# Altium schematic symbol library AD_Lib.SchLib: 1239 symbols (part 5 of 9)
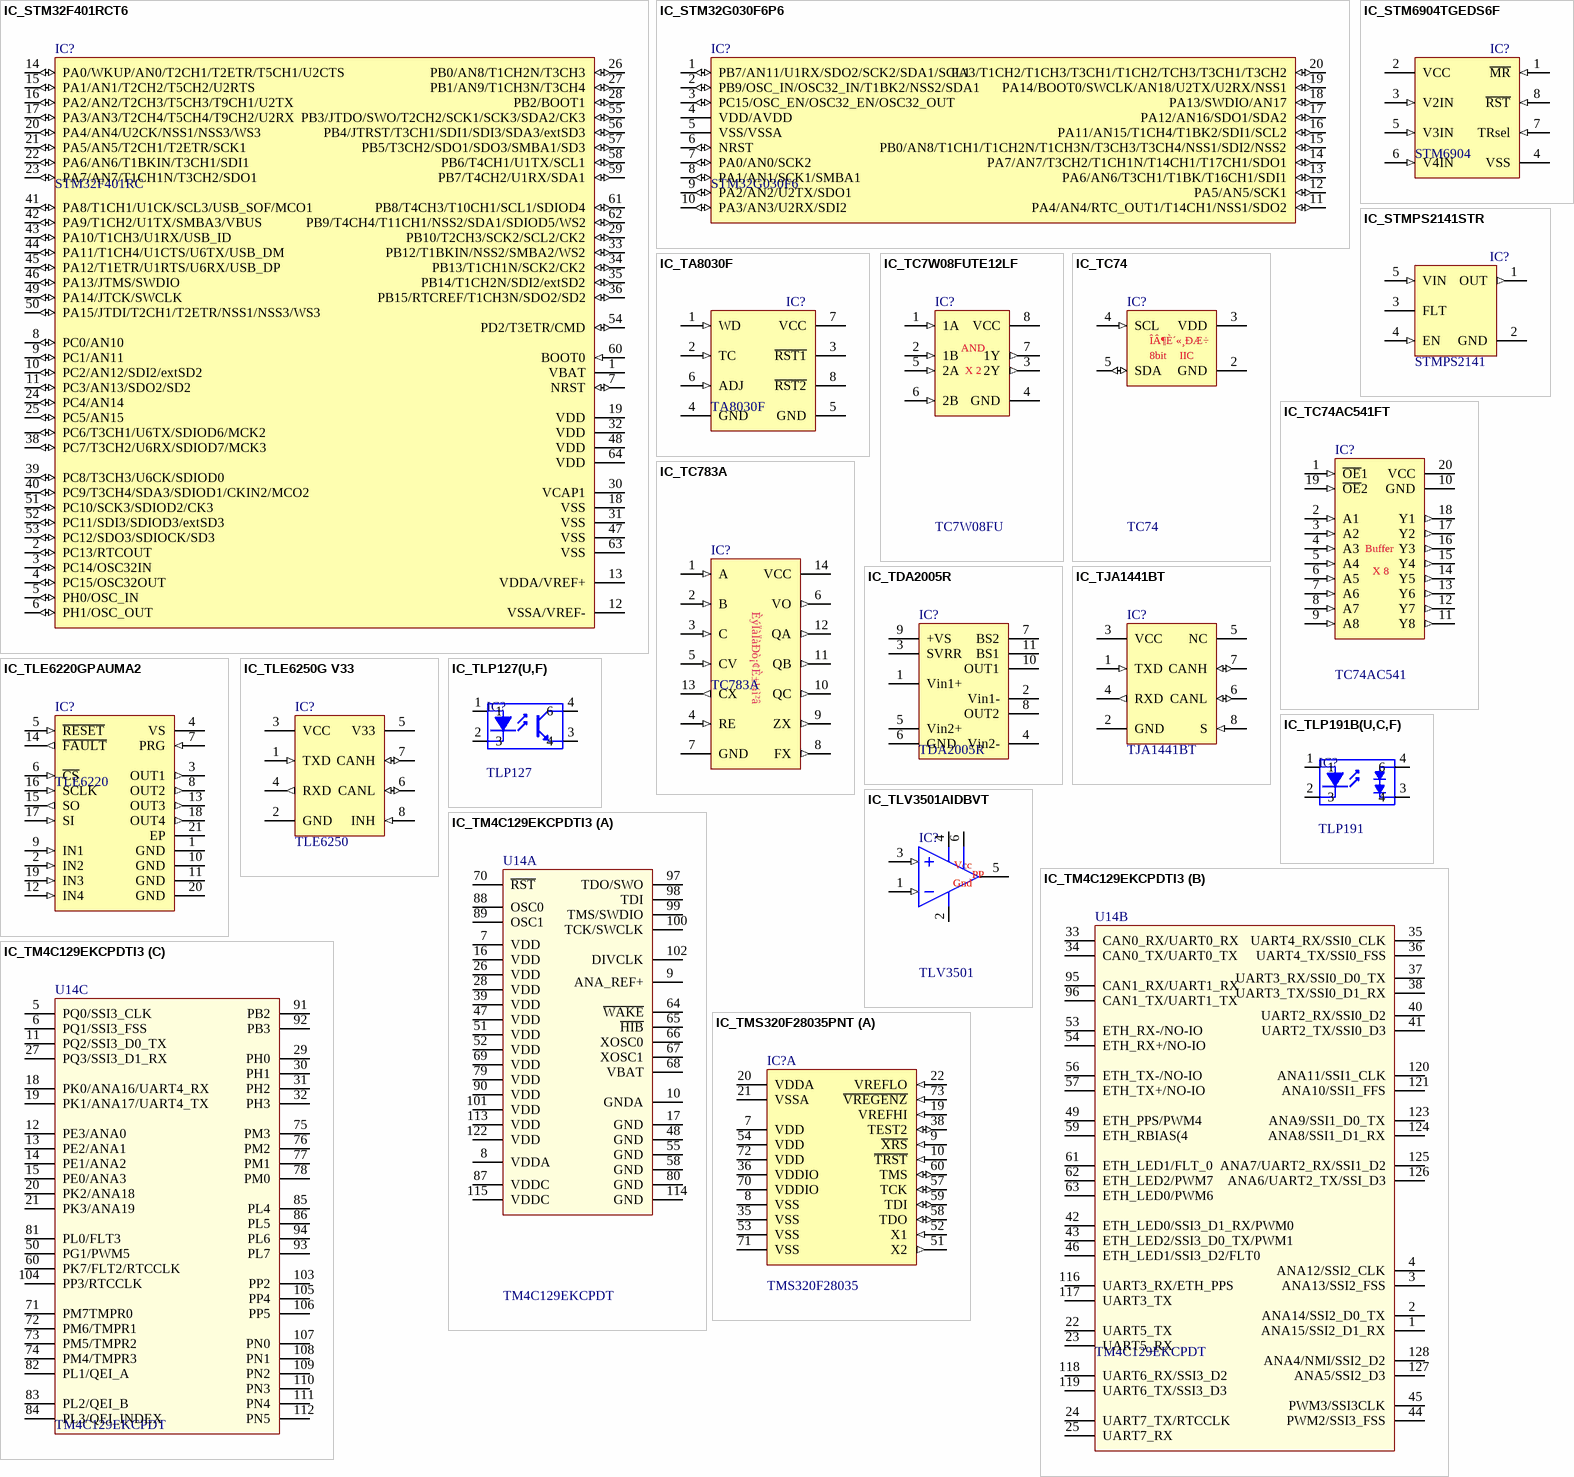
[diagram p46: symbols IC_STM32F401RCT6 to IC_TMS320F28035PNT]

## IC_TC74
designator IC?, comment TC74
ÎÂ¶È´«¸ÐÆ÷; 8bit; 2.7~5.5V; I2C;; Manufacturer: Microchip; pro-environment: RoHS; Quality: -40~85¡æ; Value: 8bit,2.7~5.5V,IIC; OPN: TC74A5-3.3VCTTR; PadsNum: 0; SN: SN; Category: ¼¯³ÉÐ¾Æ¬; Part: TC74; QTY: 3000; other: ÎÂ¶È´«¸ÐÆ÷; 8bit; 2.7~5.5V; I2C;; Price: 5.5107; OPN_JLC: OPN_JLC; SN_JLC: SN_JLC; Price_JLC: 0
footprint SOT23-5 (SOT23, 5-Leads, Body 2.9x1.6mm, Pitch 0.95mm, Lead Span 2.7mm, IPC Low Density)
pins: 2 GND (power), 3 VDD (power), 4 SCL (in), 5 SDA (io)
text: ÎÂ¶È´«¸ÐÆ÷; 8bit; IIC

## IC_TC74AC541FT
designator IC?, comment TC74AC541
»º³åÆ÷;8bit; Manufacturer: Toshiba; pro-environment: RoHS; Quality: -65~125¡æ; Value: Buffer; other: Vcc=2~5.5V; OPN: TC74AC541FT; PadsNum: 0; SN: SN; Category: ¼¯³ÉÐ¾Æ¬; Part: TC74AC541; Price: ?; OPN_JLC: OPN_JLC; SN_JLC: SN_JLC; Price_JLC: 0
footprint TSSOP-20 (Shrink Small Outline; 20 Leads; Body Width 4.4 mm; Pitch 0.65 mm)
pins: 1 ~{OE}1 (in), 2 A1 (in), 3 A2 (in), 4 A3 (in), 5 A4 (in), 6 A5 (in), 7 A6 (in), 8 A7 (in), 9 A8 (in), 10 GND (power), 11 Y8 (out), 12 Y7 (out), 13 Y6 (out), 14 Y5 (out), 15 Y4 (out), 16 Y3 (out), 17 Y2 (out), 18 Y1 (out), 19 ~{OE}2 (in), 20 VCC (power)
text: X 8

## IC_TC783A
designator IC?, comment TC783A
3ÏàÏàÐò¼ì²â;È±Ïà¼ì²â; Manufacturer: Î÷°²¹ã½ÇµçÁ¦µç×Ó¿ª·¢²¿; Quality: -40~125¡æ; Value: ÏàÐò,È±Ïà¼ì²â; pro-environment: RoHS; PadsNum: 0; SN: SN; other: 3ÏàÏàÐò¼ì²â;È±Ïà¼ì²â; Category: ¼¯³ÉÐ¾Æ¬; OPN: TC783A; Part: TC783A; QTY: 40; Price: 52; OPN_JLC: OPN_JLC; SN_JLC: SN_JLC; Price_JLC: 0
footprint DIP-14 (Footprint not found)
pins: 1 A (in), 2 B (in), 3 C (in), 4 RE (in), 5 CV (in), 6 VO (out), 7 GND (power), 8 FX (out), 9 ZX (out), 10 QC (out), 11 QB (out), 12 QA (out), 13 CX (out), 14 VCC (power)
text: ÈýÏàÏàÐò¡¢È±¼ì²â

## IC_TDA2005R
designator IC?, comment TDA2005R
¹¦ÂÊÔË·Å; Io=4.5A; 8~18V; Manufacturer: TI; Quality: -40~150¡æ; pro-environment: RoHS; other: Io=4.5A;22W;Ro=4¦¸; PadsNum: 0; Value: 8~18V; SN: SN; Category: ¼¯³ÉÐ¾Æ¬; OPN: TDA2005R; Part: TDA2005R; QTY: 500; Price: 14.2389; OPN_JLC: OPN_JLC; SN_JLC: SN_JLC; Price_JLC: 0
footprint TO220-11B_HT (TO, Thru-Hole, Vertical, Heatsink Mounted; 11 Bent Staggered Leads; Pitch 1.7 mm)
pins: 1 Vin1+, 2 Vin1-, 3 SVRR, 4 Vin2-, 5 Vin2+, 6 GND, 7 BS2, 8 OUT2, 9 +VS, 10 OUT1, 11 BS1

## IC_TJA1441BT
designator IC?, comment TJA1441BT
CAN Tranceiver supports CAN & CAN FD upto 5Mbd; Manufacturer: NXP; Quality: -40~150°C; Value: CAN,5MBd; pro-environment: RoHS; other: 4.5~5.5V; PadsNum: 0; Category: CAN Interface IC; OPN: TJA1441BT; Part: TJA1441BT; QTY: 75; Price_JLC: 0
footprint SO-8 (SOIC, 8-Leads, Body 4.9x3.9mm, Pitch 1.27mm, IPC Low Density)
pins: 1 TXD (in), 2 GND (power), 3 VCC (power), 4 RXD (out), 5 NC (power), 6 CANL (io), 7 CANH (io), 8 S (in)

## IC_TLE6220GPAUMA2
designator IC?, comment TLE6220
IPS,HS,4CH,1A,45V; Manufacturer: Infineon; pro-environment: RoHS; Quality: -25~85¡æ; Value: 1A,45V; OPN: TLE6220GPAUMA2; PadsNum: 0; SN: SN; Category: ¼¯³ÉÐ¾Æ¬; Part: TLE6220; QTY: 800; Price: 19.9134; OPN_JLC: OPN_JLC; SN_JLC: SN_JLC; Price_JLC: 0
footprint PowerSO-20 (20-Pin Small Outline Package 1.27 mm Pitch, IPC High Density)
pins: 1 GND (power), 2 IN2 (in), 3 OUT1 (out), 4 VS (power), 5 ~{RESET} (in), 6 ~{CS} (in), 7 PRG (in), 8 OUT2 (out), 9 IN1 (in), 10 GND (power), 11 GND (power), 12 IN4 (in), 13 OUT3 (out), 14 ~{FAULT} (out), 15 SO (out), 16 SCLK (in), 17 SI (in), 18 OUT4 (out), 19 IN3 (in), 20 GND (power), 21 EP (power)

## IC_TLE6250G V33
designator IC?, comment TLE6250
CANÊÕ·¢Æ÷,4.5~5.5V; Manufacturer: Infineon; Quality: -40~125¡æ; Value: CAN,1MBd; pro-environment: RoHS; SN: 03.4.11.25.83625001S; OPN: TLE6250G V33; PadsNum: 0; other: 4.5~5.5V; Category: ¼¯³ÉÐ¾Æ¬; Part: TLE6250; QTY: 2500; Price: 5.0427; OPN_JLC: OPN_JLC; SN_JLC: SN_JLC; Price_JLC: 0
footprint SO-8 (SOIC, 8-Leads, Body 4.9x3.9mm, Pitch 1.27mm, IPC Low Density)
pins: 1 TXD (in), 2 GND (power), 3 VCC (power), 4 RXD (out), 5 V33 (power), 6 CANL (io), 7 CANH (io), 8 INH (in)

## IC_TLP127(U,F)
designator IC?, comment TLP127
¹âñî; 200V; 0.12A; 50us/15us; Manufacturer: Avago; pro-environment: RoHS; Quality: -55~100¡æ; SN: 03.4.23.11.47P12701S; OPN: TLP127(U,F); PadsNum: 0; Value: 50us/15us; Category: ¼¯³ÉÐ¾Æ¬; Part: TLP127; QTY: 150; Price: 4.5279; OPN_JLC: OPN_JLC; SN_JLC: C5001; Price_JLC: 1.9
footprint SO-4W (Pitch=100mil£¬ÈçHCPL-181)
pins: 1 "Anode", 2 3 "Cathode", 3 4 "Emitter", 4 6 "Collector"

## IC_TLP191B(U,C,F)
designator IC?, comment TLP191
¹âñî; FETÇý¶¯; Manufacturer: Toshiba; pro-environment: RoHS; Quality: -55~100¡æ; SN: 03.4.23.11.83P19101S; Value: 500Hz; OPN: TLP191B(U,C,F); other: If=25mA,Voc=7V,2.5kV; PadsNum: 0; Category: ¼¯³ÉÐ¾Æ¬; Part: TLP191; QTY: 150; Price: 13.1742; OPN_JLC: OPN_JLC; SN_JLC: SN_JLC; Price_JLC: 0
footprint SO-4W (Pitch=100mil£¬ÈçHCPL-181)
pins: 1 "Anode", 2 3 "Cathode", 3 4 "Emitter", 4 6 "Collector"

## IC_TLV3501AIDBVT
designator IC?, comment TLV3501
±È½ÏÆ÷; 1P; Io=5mA; Manufacturer: TI; Quality: -40~125¡æ; Value: 2.2V~5.5V;; pro-environment: RoHS; other: Io=5mA; Êä³ö¼¶=ÍÆÍì; OPN: TLV3501AIDBVT; PadsNum: 6; SN: SN; Category: ¼¯³ÉÐ¾Æ¬; Part: TLV3501; QTY: 250; Price: 16.2155; OPN_JLC: TLV3501AIDBVR; SN_JLC: C193413; Price_JLC: 7.33
footprint SOT23-6 (SOT23, 6-Leads, Body 2.9x1.6mm, Pitch 0.95mm, Lead Span 2.7mm, IPC Low Density)
pins: 1 IN- (in), 2 GND (power), 3 IN+ (in), 4 VCC (power), 5 OUT (oc), 6 SHDN (power)
text: Vcc; PP; Gnd

## IC_TM4C129EKCPDTI3
designator U14, comment TM4C129EKCPDT
32bit MCU,120MHz,512KB Flash, 256KB RAM; Manufacturer: TI; pro-environment: RoHS; Quality: -40~105¡æ; SN: 03.4.11.27.71C12901S; Value: 32bit MCU;120MHz;512 KB Flash, 256KB RAM; OPN: TM4C129EKCPDTI3; PadsNum: 0; Category: ¼¯³ÉÐ¾Æ¬; Part: TM4C129EKCPDT; QTY: 90; Price: 113.0337; OPN_JLC: OPN_JLC; SN_JLC: SN_JLC; Price_JLC: 0
footprint TQFP-128 (Footprint not found)
part A pins: 7 VDD, 8 VDDA, 9 ANA_REF+, 10 GNDA, 16 VDD, 17 GND, 26 VDD, 28 VDD, 39 VDD, 47 VDD, 48 GND, 51 VDD, 52 VDD, 55 GND, 58 GND, 64 ~{WAKE}, 65 ~{HIB}, 66 XOSC0, 67 XOSC1, 68 VBAT, 69 VDD, 70 ~{RST}, 79 VDD, 80 GND, 87 VDDC, 88 OSC0, 89 OSC1, 90 VDD, 97 TDO/SWO, 98 TDI, 99 TMS/SWDIO, 100 TCK/SWCLK, 101 VDD, 102 DIVCLK, 113 VDD, 114 GND, 115 VDDC, 122 VDD
part B pins: 1 ANA15/SSI2_D1_RX, 2 ANA14/SSI2_D0_TX, 3 ANA13/SSI2_FSS, 4 ANA12/SSI2_CLK, 22 UART5_TX, 23 UART5_RX, 24 UART7_TX/RTCCLK, 25 UART7_RX, 33 CAN0_RX/UART0_RX, 34 CAN0_TX/UART0_TX, 35 UART4_RX/SSI0_CLK, 36 UART4_TX/SSI0_FSS, 37 UART3_RX/SSI0_D0_TX, 38 UART3_TX/SSI0_D1_RX, 40 UART2_RX/SSI0_D2, 41 UART2_TX/SSI0_D3, 42 ETH_LED0/SSI3_D1_RX/PWM0, 43 ETH_LED2/SSI3_D0_TX/PWM1, 44 PWM2/SSI3_FSS, 45 PWM3/SSI3CLK, 46 ETH_LED1/SSI3_D2/FLT0, 49 ETH_PPS/PWM4, 53 ETH_RX-/NO-IO, 54 ETH_RX+/NO-IO, 56 ETH_TX-/NO-IO, 57 ETH_TX+/NO-IO, 59 ETH_RBIAS(4, 61 ETH_LED1/FLT_0, 62 ETH_LED2/PWM7, 63 ETH_LED0/PWM6, 95 CAN1_RX/UART1_RX, 96 CAN1_TX/UART1_TX, 116 UART3_RX/ETH_PPS, 117 UART3_TX, 118 UART6_RX/SSI3_D2, 119 UART6_TX/SSI3_D3, 120 ANA11/SSI1_CLK, 121 ANA10/SSI1_FFS, 123 ANA9/SSI1_D0_TX, 124 ANA8/SSI1_D1_RX, 125 ANA7/UART2_RX/SSI1_D2, 126 ANA6/UART2_TX/SSI_D3, 127 ANA5/SSI2_D3, 128 ANA4/NMI/SSI2_D2
part C pins: 5 PQ0/SSI3_CLK, 6 PQ1/SSI3_FSS, 11 PQ2/SSI3_D0_TX, 12 PE3/ANA0, 13 PE2/ANA1, 14 PE1/ANA2, 15 PE0/ANA3, 18 PK0/ANA16/UART4_RX, 19 PK1/ANA17/UART4_TX, 20 PK2/ANA18, 21 PK3/ANA19, 27 PQ3/SSI3_D1_RX, 29 PH0, 30 PH1, 31 PH2, 32 PH3, 50 PG1/PWM5, 60 PK7/FLT2/RTCCLK, 71 PM7TMPR0, 72 PM6/TMPR1, 73 PM5/TMPR2, 74 PM4/TMPR3, 75 PM3, 76 PM2, 77 PM1, 78 PM0, 81 PL0/FLT3, 82 PL1/QEI_A, 83 PL2/QEI_B, 84 PL3/QEI_INDEX, 85 PL4, 86 PL5, 91 PB2, 92 PB3, 93 PL7, 94 PL6, 103 PP2, 104 PP3/RTCCLK, 105 PP4, 106 PP5, 107 PN0, 108 PN1, 109 PN2, 110 PN3, 111 PN4, 112 PN5

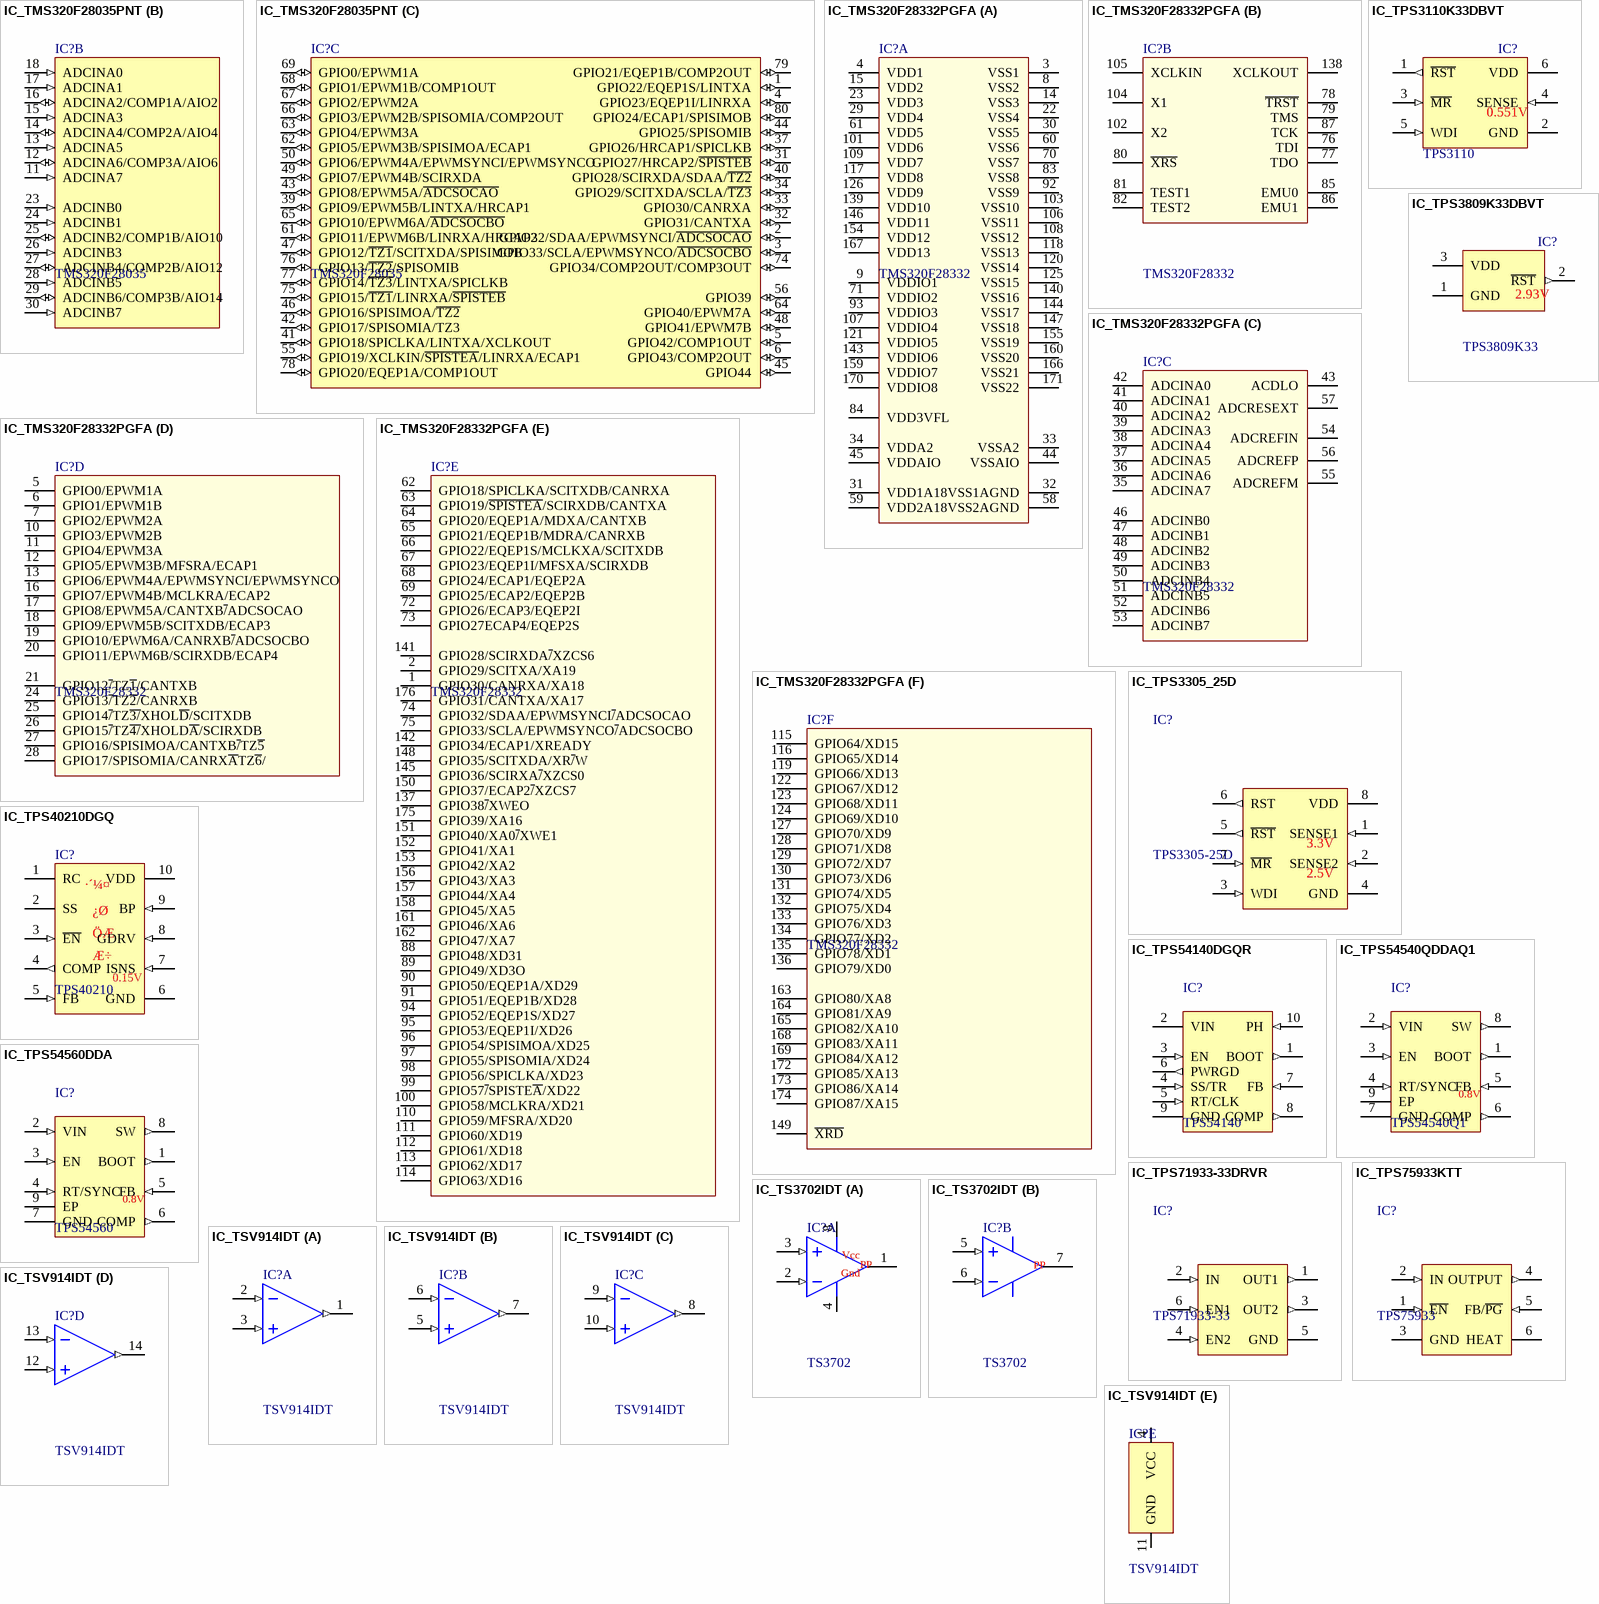
[diagram p20: symbols IC_TMS320F28035PNT to IC_TSV914IDT]

## IC_TMS320F28035PNT
designator IC?, comment TMS320F28035
32bit MCU,60MHz,128 KB Flash, 20KB RAM; Manufacturer: TI; pro-environment: RoHS; Quality: -40~85¡æ; Value: 32bit MCU;100MHz;128 KB Flash, 52KB RAM; OPN: TMS320F28035PNT; PadsNum: 0; SN: SN; Category: ¼¯³ÉÐ¾Æ¬; Part: TMS320F28035; QTY: 119; Price: 60.1612; OPN_JLC: OPN_JLC; SN_JLC: SN_JLC; Price_JLC: 0
footprint LQFP-80 (80-Pin Thin Quad Flat Pack 0.65 mm Pitch, IPC Low Density)
part A pins: 7 VDD (power), 8 VSS (power), 9 ~{XRS} (in), 10 ~{TRST} (in), 19 VREFHI (in), 20 VDDA (power), 21 VSSA (power), 22 VREFLO (in), 35 VSS (power), 36 VDDIO (power), 38 TEST2 (io), 51 X2 (out), 52 X1 (in), 53 VSS (power), 54 VDD (power), 57 TCK (io), 58 TDO (io), 59 TDI (io), 60 TMS (io), 70 VDDIO (power), 71 VSS (power), 72 VDD (power), 73 ~{VREGENZ} (in)
part B pins: 11 ADCINA7 (in), 12 ADCINA6/COMP3A/AIO6 (io), 13 ADCINA5 (in), 14 ADCINA4/COMP2A/AIO4 (io), 15 ADCINA3 (in), 16 ADCINA2/COMP1A/AIO2 (io), 17 ADCINA1 (in), 18 ADCINA0 (in), 23 ADCINB0 (in), 24 ADCINB1 (in), 25 ADCINB2/COMP1B/AIO10 (io), 26 ADCINB3 (in), 27 ADCINB4/COMP2B/AIO12 (io), 28 ADCINB5 (in), 29 ADCINB6/COMP3B/AIO14 (io), 30 ADCINB7 (in)
part C pins: 1 GPIO22/EQEP1S/LINTXA (io), 2 GPIO32/SDAA/EPWMSYNCI/~{ADCSOCAO} (io), 3 GPIO33/SCLA/EPWMSYNCO/~{ADCSOCBO} (io), 4 GPIO23/EQEP1I/LINRXA (io), 5 GPIO42/COMP1OUT (io), 6 GPIO43/COMP2OUT (io), 31 GPIO27/HRCAP2/~{SPISTEB} (io), 32 GPIO31/CANTXA (io), 33 GPIO30/CANRXA (io), 34 GPIO29/SCITXDA/SCLA/~{TZ3} (io), 37 GPIO26/HRCAP1/SPICLKB (io), 39 GPIO9/EPWM5B/LINTXA/HRCAP1 (io), 40 GPIO28/SCIRXDA/SDAA/~{TZ2} (io), 41 GPIO18/SPICLKA/LINTXA/XCLKOUT (io), 42 GPIO17/SPISOMIA/TZ3 (io), 43 GPIO8/EPWM5A/~{ADCSOCAO} (io), 44 GPIO25/SPISOMIB (io), 45 GPIO44 (io), 46 GPIO16/SPISIMOA/~{TZ2} (io), 47 GPIO12/~{TZ1}/SCITXDA/SPISIMOB (io), 48 GPIO41/EPWM7B (io), 49 GPIO7/EPWM4B/SCIRXDA (io), 50 GPIO6/EPWM4A/EPWMSYNCI/EPWMSYNCO (io), 55 GPIO19/XCLKIN/~{SPISTEA}/LINRXA/ECAP1 (io), 56 GPIO39 (io), 61 GPIO11/EPWM6B/LINRXA/HRCAP2 (io), 62 GPIO5/EPWM3B/SPISIMOA/ECAP1 (io), 63 GPIO4/EPWM3A (io), 64 GPIO40/EPWM7A (io), 65 GPIO10/EPWM6A/~{ADCSOCBO} (io), 66 GPIO3/EPWM2B/SPISOMIA/COMP2OUT (io), 67 GPIO2/EPWM2A (io), 68 GPIO1/EPWM1B/COMP1OUT (io), 69 GPIO0/EPWM1A (io), 74 GPIO34/COMP2OUT/COMP3OUT (io), 75 GPIO15/~{TZ1}/LINRXA/~{SPISTEB} (io), 76 GPIO13/~{TZ2}/SPISOMIB (io), 77 GPIO14/~{TZ3}/LINTXA/SPICLKB (io), 78 GPIO20/EQEP1A/COMP1OUT (io), 79 GPIO21/EQEP1B/COMP2OUT (io), 80 GPIO24/ECAP1/SPISIMOB (io)

## IC_TMS320F28332PGFA
designator IC?, comment TMS320F28332
32bit MCU,100MHz,128 KB Flash, 52KB RAM; Manufacturer: TI; pro-environment: RoHS; Quality: -40~85¡æ; Value: 32bit MCU;100MHz;128 KB Flash, 52KB RAM; OPN: TMS320F28332PGFA; PadsNum: 0; SN: SN; Category: ¼¯³ÉÐ¾Æ¬; Part: TMS320F28332; QTY: 40; Price: 123.3765; OPN_JLC: OPN_JLC; SN_JLC: SN_JLC; Price_JLC: 0
footprint LQFP-176 (Footprint not found)
part A pins: 3 VSS1, 4 VDD1, 8 VSS2, 9 VDDIO1, 14 VSS3, 15 VDD2, 22 VSS4, 23 VDD3, 29 VDD4, 30 VSS5, 31 VDD1A18, 32 VSS1AGND, 33 VSSA2, 34 VDDA2, 44 VSSAIO, 45 VDDAIO, 58 VSS2AGND, 59 VDD2A18, 60 VSS6, 61 VDD5, 70 VSS7, 71 VDDIO2, 83 VSS8, 84 VDD3VFL, 92 VSS9, 93 VDDIO3, 101 VDD6, 103 VSS10, 106 VSS11, 107 VDDIO4, 108 VSS12, 109 VDD7, 117 VDD8, 118 VSS13, 120 VSS14, 121 VDDIO5, 125 VSS15, 126 VDD9, 139 VDD10, 140 VSS16, 143 VDDIO6, 144 VSS17, 146 VDD11, 147 VSS18, 154 VDD12, 155 VSS19, 159 VDDIO7, 160 VSS20, 166 VSS21, 167 VDD13, 170 VDDIO8, 171 VSS22
part B pins: 76 TDI, 77 TDO, 78 ~{TRST}, 79 TMS, 80 ~{XRS}, 81 TEST1, 82 TEST2, 85 EMU0, 86 EMU1, 87 TCK, 102 X2, 104 X1, 105 XCLKIN, 138 XCLKOUT
part C pins: 35 ADCINA7, 36 ADCINA6, 37 ADCINA5, 38 ADCINA4, 39 ADCINA3, 40 ADCINA2, 41 ADCINA1, 42 ADCINA0, 43 ACDLO, 46 ADCINB0, 47 ADCINB1, 48 ADCINB2, 49 ADCINB3, 50 ADCINB4, 51 ADCINB5, 52 ADCINB6, 53 ADCINB7, 54 ADCREFIN, 55 ADCREFM, 56 ADCREFP, 57 ADCRESEXT
part D pins: 5 GPIO0/EPWM1A, 6 GPIO1/EPWM1B, 7 GPIO2/EPWM2A, 10 GPIO3/EPWM2B, 11 GPIO4/EPWM3A, 12 GPIO5/EPWM3B/MFSRA/ECAP1, 13 GPIO6/EPWM4A/EPWMSYNCI/EPWMSYNCO, 16 GPIO7/EPWM4B/MCLKRA/ECAP2, 17 GPIO8/EPWM5A/CANTXB~{/}ADCSOCAO, 18 GPIO9/EPWM5B/SCITXDB/ECAP3, 19 GPIO10/EPWM6A/CANRXB~{/}ADCSOCBO, 20 GPIO11/EPWM6B/SCIRXDB/ECAP4, 21 GPIO12~{/}TZ~{1}/CANTXB, 24 GPIO13~{/}TZ~{2}/CANRXB, 25 GPIO14~{/}TZ~{3/}XHOL~{D}/SCITXDB, 26 GPIO15~{/}TZ~{4/}XHOLD~{A}/SCIRXDB, 27 GPIO16/SPISIMOA/CANTXB~{/}TZ~{5}, 28 GPIO17/SPISOMIA/CANRX~{A}TZ~{6}/
part E pins: 1 GPIO30/CANRXA/XA18, 2 GPIO29/SCITXA/XA19, 62 GPIO18/SPICLKA/SCITXDB/CANRXA, 63 GPIO19/~{SPISTEA}/SCIRXDB/CANTXA, 64 GPIO20/EQEP1A/MDXA/CANTXB, 65 GPIO21/EQEP1B/MDRA/CANRXB, 66 GPIO22/EQEP1S/MCLKXA/SCITXDB, 67 GPIO23/EQEP1I/MFSXA/SCIRXDB, 68 GPIO24/ECAP1/EQEP2A, 69 GPIO25/ECAP2/EQEP2B, 72 GPIO26/ECAP3/EQEP2I, 73 GPIO27ECAP4/EQEP2S, 74 GPIO32/SDAA/EPWMSYNCI~{/}ADCSOCAO, 75 GPIO33/SCLA/EPWMSYNCO~{/}ADCSOCBO, 88 GPIO48/XD31, 89 GPIO49/XD3O, 90 GPIO50/EQEP1A/XD29, 91 GPIO51/EQEP1B/XD28, 94 GPIO52/EQEP1S/XD27, 95 GPIO53/EQEP1I/XD26, 96 GPIO54/SPISIMOA/XD25, 97 GPIO55/SPISOMIA/XD24, 98 GPIO56/SPICLKA/XD23, 99 GPIO57~{/}SPISTE~{A}/XD22, 100 GPIO58/MCLKRA/XD21, 110 GPIO59/MFSRA/XD20, 111 GPIO60/XD19, 112 GPIO61/XD18, 113 GPIO62/XD17, 114 GPIO63/XD16, 137 GPIO38~{/}XWEO, 141 GPIO28/SCIRXDA~{/}XZCS6, 142 GPIO34/ECAP1/XREADY, 145 GPIO36/SCIRXA~{/}XZCS0, 148 GPIO35/SCITXDA/XR~{/}W, 150 GPIO37/ECAP2~{/}XZCS7, 151 GPIO40/XA0~{/}XWE1, 152 GPIO41/XA1, 153 GPIO42/XA2, 156 GPIO43/XA3, 157 GPIO44/XA4, 158 GPIO45/XA5, 161 GPIO46/XA6, 162 GPIO47/XA7, 175 GPIO39/XA16, 176 GPIO31/CANTXA/XA17
part F pins: 115 GPIO64/XD15, 116 GPIO65/XD14, 119 GPIO66/XD13, 122 GPIO67/XD12, 123 GPIO68/XD11, 124 GPIO69/XD10, 127 GPIO70/XD9, 128 GPIO71/XD8, 129 GPIO72/XD7, 130 GPIO73/XD6, 131 GPIO74/XD5, 132 GPIO75/XD4, 133 GPIO76/XD3, 134 GPIO77/XD2, 135 GPIO78/XD1, 136 GPIO79/XD0, 149 ~{XRD}, 163 GPIO80/XA8, 164 GPIO81/XA9, 165 GPIO82/XA10, 168 GPIO83/XA11, 169 GPIO84/XA12, 172 GPIO85/XA13, 173 GPIO86/XA14, 174 GPIO87/XA15

## IC_TPS3110K33DBVT
designator IC?, comment TPS3110
µçÔ´¼àÊÓ; Manufacturer: TI; Value: 3.3V,2CH,WDT; Quality: -40~125¡æ; pro-environment: RoHS; SN: 03.4.11.11.83TPS301S; OPN: TPS3110K33DBVT; PadsNum: 0; other: µçÔ´¼àÊÓ; Category: ¼¯³ÉÐ¾Æ¬; Part: TPS3110; QTY: 250; Price: ?; OPN_JLC: OPN_JLC; SN_JLC: SN_JLC; Price_JLC: 0
footprint SOT23-6 (Footprint not found)
pins: 1 ~{RST} (out), 2 GND (power), 3 ~{MR} (in), 4 SENSE (in), 5 WDI (in), 6 VDD (power)
text: 0.551V

## IC_TPS3305_25D
designator IC?, comment TPS3305-25D
µçÔ´¼àÊÓ; Manufacturer: TI; Quality: -40~85¡æ; Value: 2.5V, 3.3V; Pro-environment: RoHS; SN: 03.4.11.11.84330501S; PadsNum: 0; Category: ¼¯³ÉÐ¾Æ¬; OPN: TPS3305-25D; Other: *; Part: TPS3305-25D; QTY: 75; Price: ?; OPN_JLC: OPN_JLC; SN_JLC: SN_JLC; Price_JLC: 0
footprint SOP-8 (Small Outline; 8 Leads; Body Width 4.3 mm; Pitc)
pins: 1 SENSE1 (in), 2 SENSE2 (in), 3 WDI (in), 4 GND (power), 5 ~{RST} (out), 6 RST (out), 7 ~{MR} (in), 8 VDD (power)
text: 3.3V; 2.5V

## IC_TPS3809K33DBVT
designator IC?, comment TPS3809K33
µçÔ´¼àÊÓ; Manufacturer: TI; Value: 2.93V; Quality: -40~125¡æ; pro-environment: RoHS; SN: 03.4.11.13.48380901S; OPN: TPS3809K33DBVT; PadsNum: 0; other: µçÔ´¼àÊÓ; Category: ¼¯³ÉÐ¾Æ¬; Part: TPS3809K33; QTY: 250; Price: 3.6738; OPN_JLC: OPN_JLC; SN_JLC: SN_JLC; Price_JLC: 0
footprint SOT23-3 (SOT-23; 3 Leads; Body 3.0 x 2.5 mm, inc. leads (LxW max))
pins: 1 GND (power), 2 ~{RST} (out), 3 VDD (power)

## IC_TPS40210DGQ
designator IC?, comment TPS40210
·´¼¤¿ØÖÆÆ÷; 4.5~52V; 6A/24V; Manufacturer: TI; Quality: -40~125¡æ; Value: 4.5~52V, 6A/24V; pro-environment: RoHS; OPN: TPS40210DGQ; PadsNum: 0; SN: SN; other: ·´¼¤¿ØÖÆÆ÷; Category: ¼¯³ÉÐ¾Æ¬; Part: TPS40210; QTY: 80; Price: 14.3442; OPN_JLC: OPN_JLC; SN_JLC: SN_JLC; Price_JLC: 0
footprint HVSSOP-10 (Footprint not found)
pins: 1 RC, 2 SS, 3 ~{EN} (in), 4 COMP (out), 5 FB (in), 6 GND (power), 7 ISNS (in), 8 GDRV (in), 9 BP (in), 10 VDD (power)
text: ·´¼¤; ¿Ø; ÖÆ; Æ÷; 0.15V

## IC_TPS54140DGQR
designator IC?, comment TPS54140
ÎÈÑ¹Ð¾Æ¬; ¿ª¹ØÐÍ; Êä³öµçÁ÷5A; Manufacturer: TI; pro-environment: RoHS; Quality: -40~125¡æ; Value: 42V,1.5A; OPN: TPS54140DGQR; other: Vin=3.5V~42V,Iout=1.5A; PadsNum: 11; SN: SN; Category: ¼¯³ÉÐ¾Æ¬; Part: TPS54140; QTY: 2500; Price: 8.6784; OPN_JLC: TPS54140DGQR; SN_JLC: C105260; Price_JLC: 2.53
footprint MSOP-10_HT (Footprint not found)
pins: 1 BOOT (out), 2 VIN (power), 3 EN (in), 4 SS/TR (in), 5 RT/CLK (in), 6 PWRGD (out), 7 FB (in), 8 COMP (out), 9 GND, 10 PH (in), 11 THERMALPAD

## IC_TPS54540QDDAQ1
designator IC?, comment TPS54540Q1
ÎÈÑ¹Ð¾Æ¬; ¿ª¹ØÐÍ; Êä³öµçÁ÷5A; Manufacturer: TI; pro-environment: RoHS; Quality: -40~125¡æ; SN: 03.4.11.11.83545401S; Value: 42V,5A; OPN: TPS54540QDDAQ1; other: Vin=4.5V~42V,Vout>=0.8 V;Iout=5A; PadsNum: 0; Category: ¼¯³ÉÐ¾Æ¬; Part: TPS54540Q1; QTY: 75; Price: ?; OPN_JLC: OPN_JLC; SN_JLC: SN_JLC; Price_JLC: 0
footprint SO-8_HT (SOIC, 8-Leads, Body 4.9x3.9mm, Pitch 1.27mm, IPC Low Density)
pins: 1 BOOT (out), 2 VIN (in), 3 EN (in), 4 RT/SYNC (in), 5 FB (in), 6 COMP (out), 7 GND (power), 8 SW (out), 9 EP (power)
text: 0.8V

## IC_TPS54560DDA
designator IC?, comment TPS54560
ÎÈÑ¹Ð¾Æ¬; ¿ª¹ØÐÍ; Êä³öµçÁ÷5A; Manufacturer: TI; pro-environment: RoHS; Quality: -40~125¡æ; SN: 03.4.11.13.47545601S; Value: 61V,5A; OPN: TPS54560DDA; other: Vin=4.5V~61V,Vout>=0.8 V;Iout=5A; PadsNum: 0; Category: ¼¯³ÉÐ¾Æ¬; Part: TPS54560; QTY: 75; Price: ?; OPN_JLC: OPN_JLC; SN_JLC: SN_JLC; Price_JLC: 0
footprint SO-8_HT (SOIC, 8-Leads, Body 4.9x3.9mm, Pitch 1.27mm, IPC Low Density)
pins: 1 BOOT (out), 2 VIN (in), 3 EN (in), 4 RT/SYNC (in), 5 FB (in), 6 COMP (out), 7 GND (power), 8 SW (out), 9 EP (power)
text: 0.8V

## IC_TPS71933-33DRVR
designator IC?, comment TPS71933-33
ÎÈÑ¹Ð¾Æ¬; LDO; 2CH; 3.3V; 0.2A; Manufacturer: TI; Value: 3.3V,0.2A; Quality: -40~125¡æ; pro-environment: RoHS; OPN: TPS71933-33DRVR; PadsNum: 0; SN: SN; Category: ¼¯³ÉÐ¾Æ¬; Part: TPS71933-33; QTY: 3000; Price: 5.876; OPN_JLC: OPN_JLC; SN_JLC: SN_JLC; Price_JLC: 0
footprint WSON-6 (TI·â×°´úÂëDRV)
pins: 1 OUT1 (out), 2 IN (in), 3 OUT2 (out), 4 EN2 (in), 5 GND (power), 6 EN1 (in), 7 HT (power)

## IC_TPS75933KTT
designator IC?, comment TPS75933
ÎÈÑ¹Ð¾Æ¬; LDO; Manufacturer: TI; Value: 2.8V-5.5V,7.5A; Quality: -40~125¡æ; pro-environment: RoHS; SN: 03.4.11.11.63593301S; OPN: TPS75933KTTT; PadsNum: 0; Category: ¼¯³ÉÐ¾Æ¬; Part: TPS75933; QTY: 50; Price: ?; OPN_JLC: OPN_JLC; SN_JLC: SN_JLC; Price_JLC: 0
footprint TO263-5 (LM2576ÏµÁÐÌùÆ¬Ôª¼þ£¬NSÄÚ²¿±àºÅTS5B)
pins: 1 ~{EN} (in), 2 IN (in), 3 GND (power), 4 OUTPUT (out), 5 FB/~{PG} (in), 6 HEAT

## IC_TS3702IDT
designator IC?, comment TS3702
±È½ÏÆ÷; 2P; Io=4mA;ÍÆÍìÊä³ö; Manufacturer: ST; Quality: -40~125¡æ; Value: 4V~16V;; pro-environment: RoHS; other: Io=4mA;Êä³ö¼¶=ÍÆÍìÊä³ö; OPN: TS3702IDT; PadsNum: 0; SN: SN; Category: ¼¯³ÉÐ¾Æ¬; Part: TS3702; QTY: 2500; Price: 1.8135; OPN_JLC: OPN_JLC; SN_JLC: SN_JLC; Price_JLC: 0
footprint SO-8 (SOIC, 8-Leads, Body 4.9x3.9mm, Pitch 1.27mm, IPC Low Density)
part A pins: 1 OUT (oc), 2 IN- (in), 3 IN+ (in), 4 GND (power), 8 VCC (power)
part B pins: 5 IN+ (in), 6 IN- (in), 7 OUT (oc)
part A text: Vcc; PP; Gnd
part B text: PP

## IC_TSV914IDT
designator IC?, comment TSV914IDT
8 MHz operational amplifiers; Manufacturer: ST; Quality: -40 ~ 125°C; Value: 2.5V~5.5V; pro-environment: RoHS; OPN: TSV914; PadsNum: 0; Category: Operational Amplifiers - Op Amps; Part: TSV914IDT; QTY: 2500; Price_JLC: 0
footprint SO-14 (SOIC, 14-Leads, Body 8.7x3.9mm, Pitch 1.27mm, IPC Low Density)
part A pins: 1 OUT1 (out), 2 IN1- (in), 3 IN+ (in)
part B pins: 5 IN2+ (in), 6 IN2- (in), 7 OUT2 (out)
part C pins: 8 OUT3 (out), 9 IN3- (in), 10 IN3+ (in)
part D pins: 12 IN4+ (in), 13 IN4- (in), 14 OUT4 (out)
part E pins: 4 VCC (power), 11 GND (power)

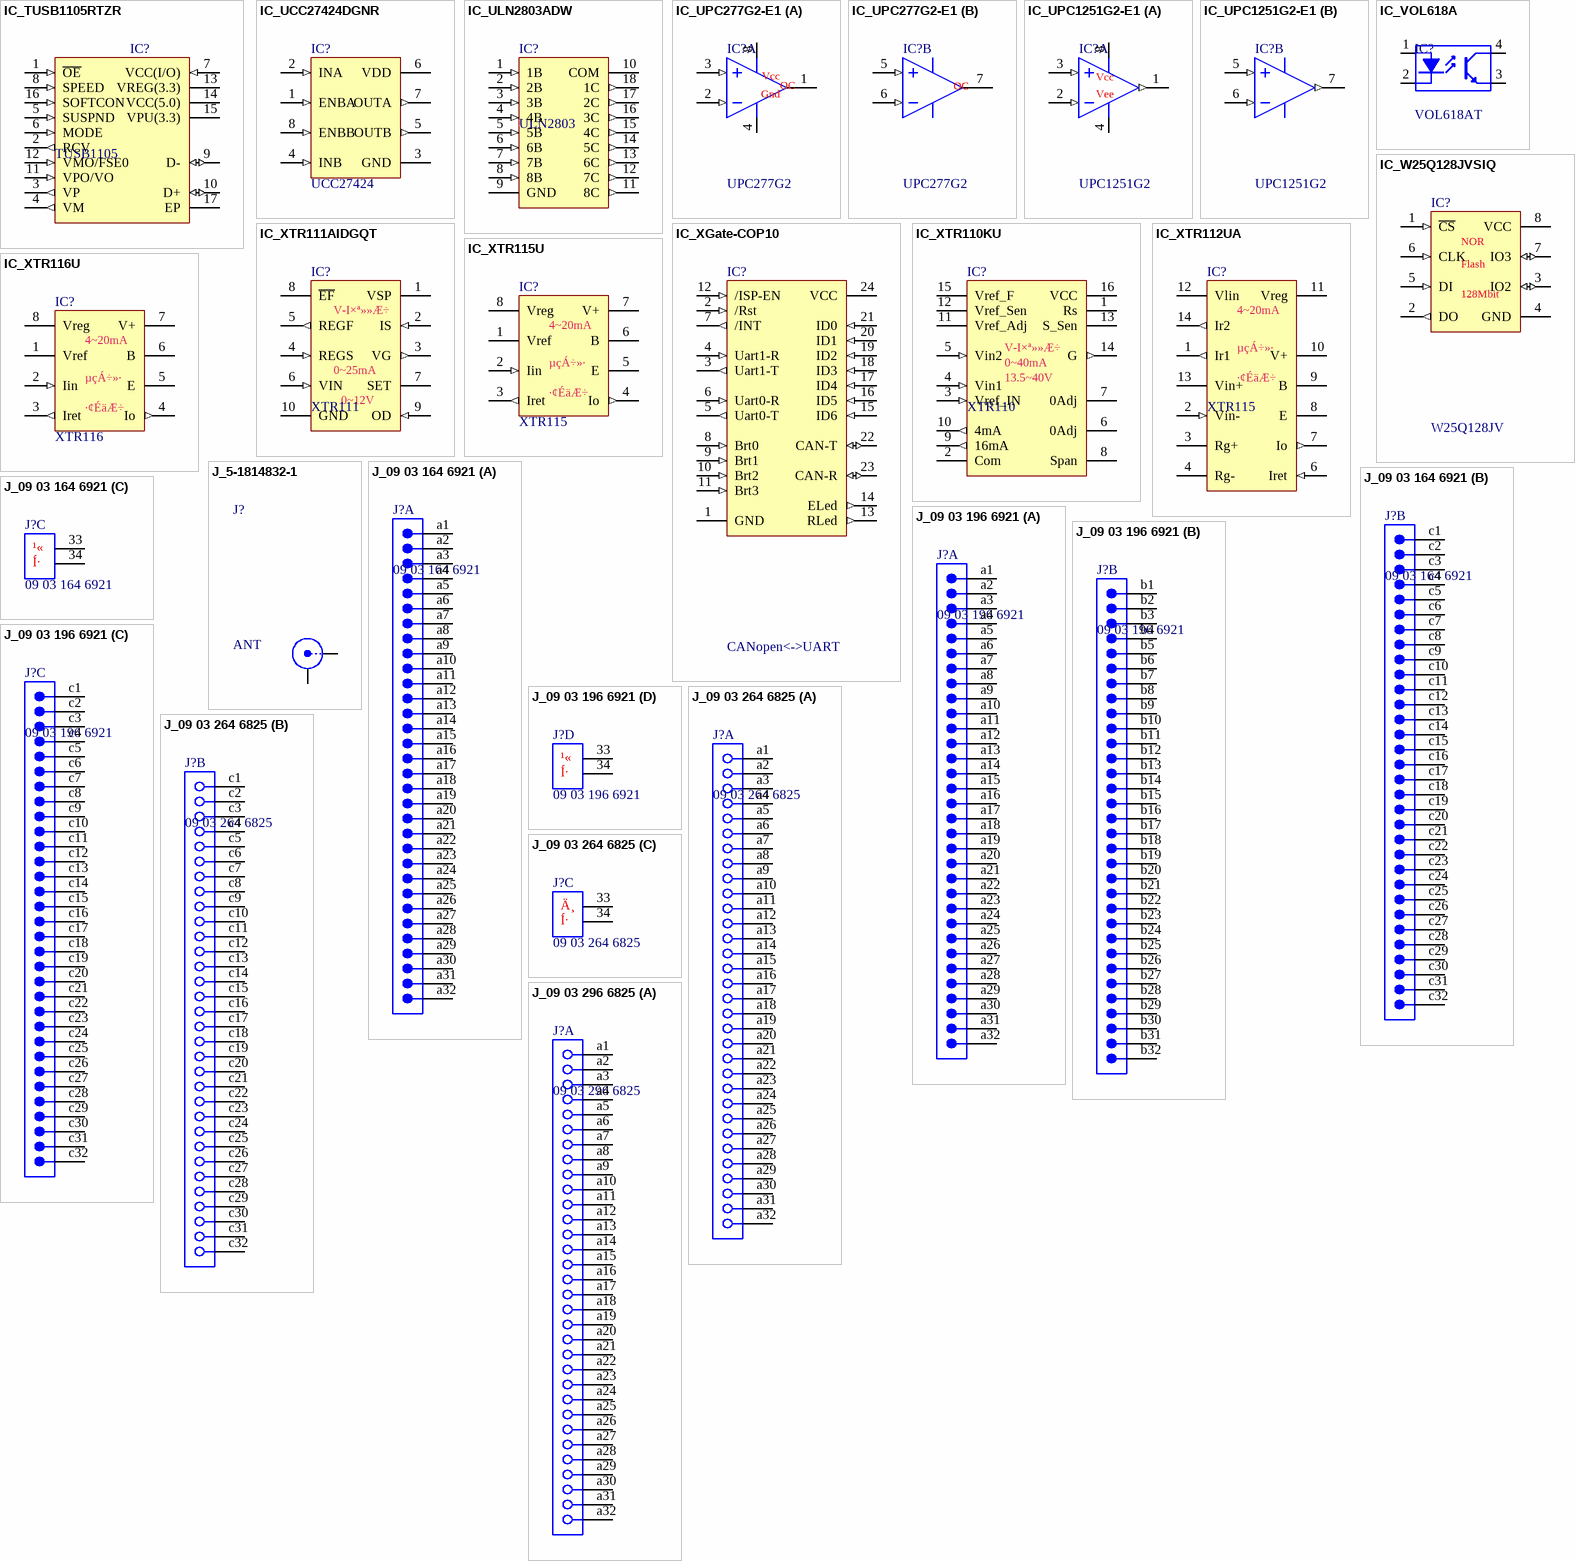
[diagram p21: symbols IC_TUSB1105RTZR to J_09 03 296 6825]

## IC_TUSB1105RTZR
designator IC?, comment TUSB1105
USBÊÕ·¢Æ÷;1.65~5.5V;12Mb/s; Manufacturer: TI; Value: 1.65V~5.5V,12Mb/s; Quality: -40~125¡æ; pro-environment: RoHS; OPN: TUSB1105RTZR; PadsNum: 0; other: USBÊÕ·¢Æ÷;1.65~5.5V;12Mb/s; SN: SN; Category: ¼¯³ÉÐ¾Æ¬; Part: TUSB1105; QTY: 3000; Price: 7.4354; OPN_JLC: OPN_JLC; SN_JLC: SN_JLC; Price_JLC: 0
footprint WQFN-16 (Footprint not found)
pins: 1 ~{OE} (in), 2 RCV (out), 3 VP (out), 4 VM (out), 5 SUSPND (in), 6 MODE (in), 7 VCC(I/O) (in), 8 SPEED (in), 9 D- (io), 10 D+ (io), 11 VPO/VO (in), 12 VMO/FSE0 (in), 13 VREG(3.3) (power), 14 VCC(5.0) (power), 15 VPU(3.3) (power), 16 SOFTCON (in), 17 EP

## IC_UCC27424DGNR
designator IC?, comment UCC27424
MOSFETÇý¶¯; 2Ch; µÍ²à; 4A; Manufacturer: TI; Quality: -40~105¡æ; Value: 4A,4~15V; pro-environment: RoHS; OPN: UCC27424DGNR; PadsNum: 8; SN: SN; Category: ¼¯³ÉÐ¾Æ¬; Part: UCC27424; QTY: 2500; Price: 6.8478; OPN_JLC: UCC27424DR; SN_JLC: C138519; Price_JLC: 2.71
footprint MSOP-8_HT (Shrink Small Outline; 8 Leads; Body Width 3 mm; Pitch 0.65 mm)
footprint SO-8 (SOIC, 8-Leads, Body 4.9x3.9mm, Pitch 1.27mm, IPC Low Density)
pins: 1 ENBA (in), 2 INA (in), 3 GND (power), 4 INB (in), 5 OUTB (out), 6 VDD (power), 7 OUTA (out), 8 ENBB (in)

## IC_ULN2803ADW
designator IC?, comment ULN2803
´ïÁÖ¶Ù¹Ü£¬8Í¨µÀ; Manufacturer: TI; pro-environment: RoHS; Quality: -65~150¡æ; SN: 03.4.11.20.47280301S; Value: 0.5A,50V; OPN: ULN2803ADW; PadsNum: 0; Category: ¼¯³ÉÐ¾Æ¬; Part: ULN2803; QTY: 40; Price: 10.092; OPN_JLC: OPN_JLC; SN_JLC: SN_JLC; Price_JLC: 0
footprint SO-18_W (18-Pin Small Outline Package 1.27 mm Pitch, IPC Low Density)
pins: 1 1B (in), 2 2B (in), 3 3B (in), 4 4B (in), 5 5B (in), 6 6B (in), 7 7B (in), 8 8B (in), 9 GND (power), 10 COM (power), 11 8C (out), 12 7C (out), 13 6C (out), 14 5C (out), 15 4C (out), 16 3C (out), 17 2C (out), 18 1C (out)

## IC_UPC277G2-E1
designator IC?, comment UPC277G2
±È½ÏÆ÷£¬2P£¬Io=16mA£¬OC; Manufacturer: NEC; Quality: -40~85¡æ; Value: 2V~32V;OC; pro-environment: RoHS; SN: 03.4.11.15.47C27701S; other: Io=16mA;Tr=1.8us; OPN: UPC277G2-E1; PadsNum: 0; Category: ¼¯³ÉÐ¾Æ¬; Part: UPC277G2; QTY: 75; Price: -; OPN_JLC: OPN_JLC; SN_JLC: SN_JLC; Price_JLC: 0
footprint SO-8 (SOIC, 8-Leads, Body 4.9x3.9mm, Pitch 1.27mm, IPC Low Density)
part A pins: 1 OUT (oc), 2 IN- (in), 3 IN+ (in), 4 GND (power), 8 VCC (power)
part B pins: 5 IN+ (in), 6 IN- (in), 7 OUT (oc)
part A text: Vcc; OC; Gnd
part B text: OC

## IC_UPC1251G2-E1
designator IC?, comment UPC1251G2
OPA;2P;Io=40mA; Manufacturer: NEC; Quality: -40~125¡æ; Value: 3V~30V;40mA; pro-environment: RoHS; SN: 03.4.11.15.47125101S; other: Io=40mA;SR=0.3V/us; OPN: UPC1251G2-E1; PadsNum: 0; Category: ¼¯³ÉÐ¾Æ¬; Part: UPC1251G2; QTY: 98; Price: ?; OPN_JLC: LM358DR2G; SN_JLC: C7950; Price_JLC: 0
footprint SO-8 (SOIC, 8-Leads, Body 4.9x3.9mm, Pitch 1.27mm, IPC Low Density)
part A pins: 1 OUTA (out), 2 INA- (in), 3 INA+ (in), 4 VEE (power), 8 VCC (power)
part B pins: 5 INB+ (in), 6 INB- (in), 7 OUTB (out)
part A text: Vcc; Vee

## IC_VOL618A
designator IC?, comment VOL618AT
Optocoupler DC-IN 1-CH Transistor DC-OUT 4-Pin LSOP; Manufacturer: Vishay; pro-environment: RoHS; Quality: -55~125°C; Value: 80V,60mA; PadsNum: 0; Category: Transistor Output Optocouplers; OPN: VOL618AT; Part: VOL618AT; QTY: 150
footprint LSOP (LSOP Wide Body Package)
pins: 1 "Anode", 2 "Cathode", 3 "Emitter", 4 "Collector"

## IC_W25Q128JVSIQ
designator IC?, comment W25Q128JV
NOR Flash; 128Mb; SPI; 3.3V; Manufacturer: Winbond; pro-environment: RoHS; Quality: -40~85¡æ; Value: 128Mb,3.3V; OPN: W25Q128JVSIQ; PadsNum: 8; SN: SN; Category: ¼¯³ÉÐ¾Æ¬; Part: W25Q128JV; QTY: 90; Price: 4.88; OPN_JLC: W25Q128JVSIQ; SN_JLC: C97521; Price_JLC: 5.73
footprint SO-8_W (8-Pin Small Outline Package 1.27 mm Pitch, IPC Low Density)
pins: 1 ~{CS} (in), 2 DO (out), 3 IO2 (io), 4 GND (power), 5 DI (in), 6 CLK (in), 7 IO3 (io), 8 VCC (power)
text: NOR; Flash; 128Mbit

## IC_XGate-COP10
designator IC?, comment CANopen<->UART
CANopen Ð­Òé×ª»»Ä£¿é; Manufacturer: ÖÂÔ¶; SN: 03.4.11.25.99COP101S; Value: 5V,1Mbps; Other: CANopen´ÓÕ¾Ä£¿é; pro-environment: RoHS; Quality: -40~85¡ãC; OPN: XGate-COP10; PadsNum: 0; Part: CANopen<->UART; OPN_JLC: OPN_JLC; SN_JLC: SN_JLC; Price_JLC: 0
footprint XGate-COP10 (¹ãÖÝÖÂÔ¶Ö®XGateÄ£¿é£¬CANopenÐ­Òé×ª»»Ä£¿é)
pins: 1 GND (power), 2 /Rst (in), 3 Uart1-T (out), 4 Uart1-R (in), 5 Uart0-T (out), 6 Uart0-R (in), 7 /INT (out), 8 Brt0 (in), 9 Brt1 (in), 10 Brt2 (in), 11 Brt3 (in), 12 /ISP-EN (in), 13 RLed (out), 14 ELed (out), 15 ID6 (in), 16 ID5 (in), 17 ID4 (in), 18 ID3 (in), 19 ID2 (in), 20 ID1 (in), 21 ID0 (in), 22 CAN-T (io), 23 CAN-R (io), 24 VCC (power)

## IC_XTR110KU
designator IC?, comment XTR110
µçÁ÷»··¢ÉäÆ÷; 0~25mA; 13.5~40V; Manufacturer: TI; Quality: -40~85¡æ; Value: 0~40mA;13.5~40V; pro-environment: RoHS; other: µçÁ÷»··¢ÉäÆ÷;0~40mA;13.5~40V; OPN: XTR110KU; PadsNum: 16; SN: SN; Category: ¼¯³ÉÐ¾Æ¬; Part: XTR110; QTY: 40; Price: 107.0449; OPN_JLC: XTR110KU; SN_JLC: C38819; Price_JLC: 97.09
footprint SO-16_W (¿íÌåSO-16£¬ÈçADuM1410BRWZ)
pins: 1 Rs, 2 Com, 3 Vref_IN (in), 4 Vin1 (in), 5 Vin2 (in), 6 0Adj, 7 0Adj, 8 Span, 9 16mA (out), 10 4mA (out), 11 Vref_Adj, 12 Vref_Sen, 13 S_Sen, 14 G (out), 15 Vref_F, 16 VCC (power)
text: V-I×ª»»Æ÷; 0~40mA; 13.5~40V

## IC_XTR111AIDGQT
designator IC?, comment XTR111
µçÁ÷»··¢ÉäÆ÷; 0~25mA; 8~40V; Manufacturer: TI; Quality: -40~125¡æ; pro-environment: RoHS; OPN: XTR111AIDGQT; PadsNum: 0; Value: 0~25mA;8~40V; SN: SN; other: µçÁ÷»··¢ÉäÆ÷; 0~25mA; 8~40V; Category: ¼¯³ÉÐ¾Æ¬; Part: XTR111; QTY: 250; Price: 14.9725; OPN_JLC: XTR111AIDGQT; SN_JLC: C523789; Price_JLC: 9.12
footprint MSOP-10_HT (Body Width 3 mm; Pitch 0.5 mm;(uMAX-10&RM-10))
pins: 1 VSP (power), 2 IS (in), 3 VG (out), 4 REGS (in), 5 REGF (out), 6 VIN (in), 7 SET, 8 ~{EF} (oc), 9 OD (in), 10 GND (power), 11 HT (power)
text: V-I×ª»»Æ÷; 0~25mA; 0~12V

## IC_XTR112UA
designator IC?, comment XTR115
µçÁ÷»··¢ÉäÆ÷; 4~20mA; Manufacturer: TI; Quality: -40~85¡æ; pro-environment: RoHS; other: 7.5~36V;»·Â·¹©µç;Vref=2.5V; OPN: XTR112UA; PadsNum: 0; Value: 4~20mA; SN: SN; Category: ¼¯³ÉÐ¾Æ¬; Part: XTR115; QTY: 50; Price: 77.0208; OPN_JLC: OPN_JLC; SN_JLC: SN_JLC; Price_JLC: 0
footprint SO-14 (SOIC, 14-Leads, Body 8.7x3.9mm, Pitch 1.27mm, IPC Low Density)
pins: 1 Ir1 (out), 2 Vin- (in), 3 Rg+, 4 Rg-, 6 Iret (in), 7 Io (out), 8 E, 9 B, 10 V+ (power), 11 Vreg (power), 12 Vlin (power), 13 Vin+ (power), 14 Ir2 (out)
text: µçÁ÷»·; ·¢ÉäÆ÷

## IC_XTR115U
designator IC?, comment XTR115
µçÁ÷»··¢ÉäÆ÷; 4~20mA; Manufacturer: TI; Quality: -40~85¡æ; pro-environment: RoHS; SN: 03.4.11.22.84R11501S; other: 7.5~36V;»·Â·¹©µç;Vref=2.5V; OPN: XTR115U; PadsNum: 0; Value: 4~20mA; Category: ¼¯³ÉÐ¾Æ¬; Part: XTR115; QTY: 75; Price: 26.676; OPN_JLC: XTR115U/2K5; SN_JLC: C99444; Price_JLC: 0
footprint SO-8 (SOIC, 8-Leads, Body 4.9x3.9mm, Pitch 1.27mm, IPC Low Density)
pins: 1 Vref (power), 2 Iin (in), 3 Iret (out), 4 Io (out), 5 E, 6 B, 7 V+ (power), 8 Vreg (power)
text: µçÁ÷»·; ·¢ÉäÆ÷

## IC_XTR116U
designator IC?, comment XTR116
µçÁ÷»··¢ÉäÆ÷,4~20mA; Manufacturer: TI; Quality: -40~85¡æ; pro-environment: RoHS; other: 7.5~36V;»·Â·¹©µç;Vref=4.096V; OPN: XTR116U; PadsNum: 0; Value: 4~20mA; SN: SN; Category: ¼¯³ÉÐ¾Æ¬; Part: XTR116; QTY: 75; Price: 32.0112; OPN_JLC: OPN_JLC; SN_JLC: SN_JLC; Price_JLC: 0
footprint SO-8 (SOIC, 8-Leads, Body 4.9x3.9mm, Pitch 1.27mm, IPC Low Density)
pins: 1 Vref (power), 2 Iin (in), 3 Iret (out), 4 Io (out), 5 E, 6 B, 7 V+ (power), 8 Vreg (power)
text: µçÁ÷»·; ·¢ÉäÆ÷

## J_5-1814832-1
designator J?, comment ANT
SMA; Female; SMT; Manufacturer: TE; Quality: -55~105¡ãC; pro-environment: RoHS; Value: ANT, Female; OPN: 5-1814832-1; PadsNum: 0; other: SMA; SN: SN; Category: Á¬½ÓÆ÷; Part: ANT; QTY: 50; Price: 10.6353; OPN_JLC: OPN_JLC; SN_JLC: SN_JLC; Price_JLC: 0
footprint U.FL-R-SMT(01) (ÌìÏß²å×ù)
pins: 1 X, 2 Y

## J_09 03 164 6921
designator J?, comment 09 03 164 6921
Harting,Male,2*32; Quality: -50~125¡æ; Value: Male,64P; pro-environment: RoHS; SN: 03.4.31.35.99692102S; other: ¹þ¶¡±³°åÁ¬½ÓÆ÷£¬µ¥°åÓÃ; PadsNum: 0; Manufacturer: Harting; Category: Á¬½ÓÆ÷; OPN: 09 03 164 6921; Part: 09 03 164 6921; QTY: 100; Price: 19.0827; OPN_JLC: OPN_JLC; SN_JLC: SN_JLC; Price_JLC: 0
footprint 09 03 164 6921 (¹þ¶¡±³°å½ÓÍ·)
part A pins: a1, a2, a3, a4, a5, a6, a7, a8, a9, a10, a11, a12, a13, a14, a15, a16, a17, a18, a19, a20, a21, a22, a23, a24, a25, a26, a27, a28, a29, a30, a31, a32
part B pins: c1, c2, c3, c4, c5, c6, c7, c8, c9, c10, c11, c12, c13, c14, c15, c16, c17, c18, c19, c20, c21, c22, c23, c24, c25, c26, c27, c28, c29, c30, c31, c32
part C pins: 33 MH1 "Mounting Fixture", 34 MH2 "Mounting Fixture"
part C text: ¹«; Í·

## J_09 03 196 6921
designator J?, comment 09 03 196 6921
Harting,Male,3*32; Quality: -50~125¡æ; Value: Male,96P; pro-environment: RoHS; SN: 03.4.31.35.99692103S; other: ¹þ¶¡±³°åÁ¬½ÓÆ÷£¬µ¥°åÓÃ; PadsNum: 0; Manufacturer: Harting; Category: Á¬½ÓÆ÷; OPN: 09 03 196 6921; Part: 09 03 196 6921; QTY: 20; Price: 26.1144; OPN_JLC: OPN_JLC; SN_JLC: SN_JLC; Price_JLC: 0
footprint 09 03 196 6921 (¹þ¶¡±³°å½ÓÍ·£¬¹«Í·£¬96P)
part A pins: a1, a2, a3, a4, a5, a6, a7, a8, a9, a10, a11, a12, a13, a14, a15, a16, a17, a18, a19, a20, a21, a22, a23, a24, a25, a26, a27, a28, a29, a30, a31, a32
part B pins: b1, b2, b3, b4, b5, b6, b7, b8, b9, b10, b11, b12, b13, b14, b15, b16, b17, b18, b19, b20, b21, b22, b23, b24, b25, b26, b27, b28, b29, b30, b31, b32
part C pins: c1, c2, c3, c4, c5, c6, c7, c8, c9, c10, c11, c12, c13, c14, c15, c16, c17, c18, c19, c20, c21, c22, c23, c24, c25, c26, c27, c28, c29, c30, c31, c32
part D pins: 33 MH1 "Mounting Fixture", 34 MH2 "Mounting Fixture"
part D text: ¹«; Í·
